# Altium integrated library My_Lib.IntLib: 28 symbols (part 1 of 2)
Pins are listed as number, name and electrical type; pins without a type are passive.

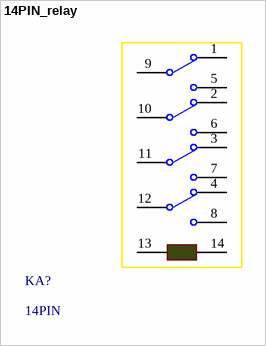
[diagram p0: symbol 14PIN_relay]

## 14PIN_relay
designator KA?, comment 14PIN
14脚继电器
pins: 1, 2, 3, 4, 5, 6, 7, 8, 9, 10, 11, 12, 13, 14


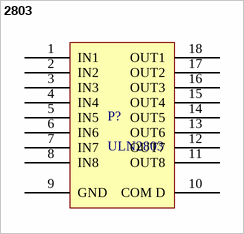
[diagram p1: symbol 2803]

## 2803
designator P?, comment ULN2803
非门
footprint 2803 (非门)
pins: 1 IN1, 2 IN2, 3 IN3, 4 IN4, 5 IN5, 6 IN6, 7 IN7, 8 IN8, 9 GND, 10 COM D, 11 OUT8, 12 OUT7, 13 OUT6, 14 OUT5, 15 OUT4, 16 OUT3, 17 OUT2, 18 OUT1


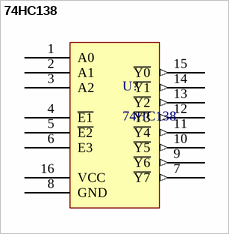
[diagram p2: symbol 74HC138]

## 74HC138
designator U?
38译码器
footprint 74HC138 (38译码器)
pins: 1 A0, 2 A1, 3 A2, 4 ~{E1}, 5 ~{E2}, 6 E3, 7 ~{Y7} (out), 8 GND, 9 ~{Y6} (out), 10 ~{Y5} (out), 11 ~{Y4} (out), 12 ~{Y3} (out), 13 ~{Y2} (out), 14 ~{Y1} (out), 15 ~{Y0} (out), 16 VCC (power)


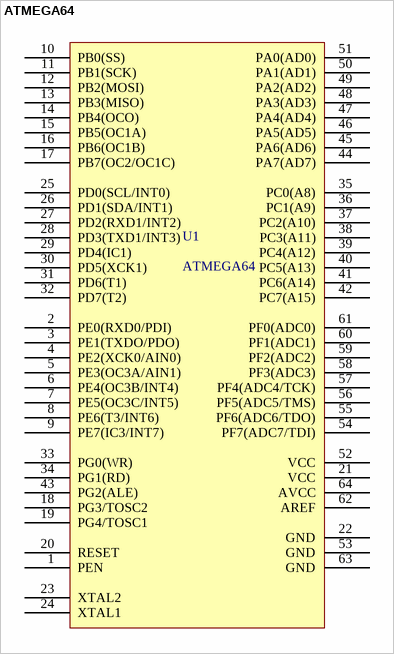
[diagram p3: symbol ATMEGA64]

## ATMEGA64
designator U1
单片机
footprint QFP64-1 (ATMEGA64)
pins: 1 PEN, 2 PE0(RXD0/PDI), 3 PE1(TXDO/PDO), 4 PE2(XCK0/AIN0), 5 PE3(OC3A/AIN1), 6 PE4(OC3B/INT4), 7 PE5(OC3C/INT5), 8 PE6(T3/INT6), 9 PE7(IC3/INT7), 10 PB0(SS), 11 PB1(SCK), 12 PB2(MOSI), 13 PB3(MISO), 14 PB4(OCO), 15 PB5(OC1A), 16 PB6(OC1B), 17 PB7(OC2/OC1C), 18 PG3/TOSC2, 19 PG4/TOSC1, 20 RESET, 21 VCC, 22 GND, 23 XTAL2, 24 XTAL1, 25 PD0(SCL/INT0), 26 PD1(SDA/INT1), 27 PD2(RXD1/INT2), 28 PD3(TXD1/INT3), 29 PD4(IC1), 30 PD5(XCK1), 31 PD6(T1), 32 PD7(T2), 33 PG0(WR), 34 PG1(RD), 35 PC0(A8), 36 PC1(A9), 37 PC2(A10), 38 PC3(A11), 39 PC4(A12), 40 PC5(A13), 41 PC6(A14), 42 PC7(A15), 43 PG2(ALE), 44 PA7(AD7), 45 PA6(AD6), 46 PA5(AD5), 47 PA4(AD4), 48 PA3(AD3), 49 PA2(AD2), 50 PA1(AD1), 51 PA0(AD0), 52 VCC, 53 GND, 54 PF7(ADC7/TDI), 55 PF6(ADC6/TDO), 56 PF5(ADC5/TMS), 57 PF4(ADC4/TCK), 58 PF3(ADC3), 59 PF2(ADC2), 60 PF1(ADC1), 61 PF0(ADC0), 62 AREF, 63 GND, 64 AVCC


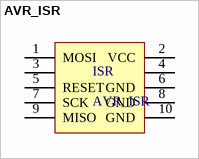
[diagram p4: symbol AVR_ISR]

## AVR_ISR
designator ISR
AVR单片机下载器
footprint AVR_10 (烧录器)
pins: 1 MOSI, 2 VCC, 3, 4, 5 RESET, 6 GND, 7 SCK, 8 GND, 9 MISO, 10 GND


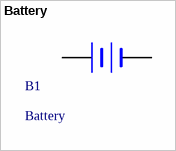
[diagram p5: symbol Battery]

## Battery
designator B1
电源
footprint Battery (电源座)
pins: 1 +, 2 -


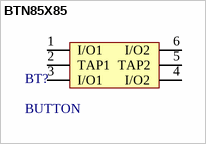
[diagram p6: symbol BTN85X85]

## BTN85X85
designator BT?, comment BUTTON
自锁按键
footprint BTN85X85 (自锁按键)
pins: 1 I/O1, 2 TAP1, 3 I/O1, 4 I/O2, 5 TAP2, 6 I/O2


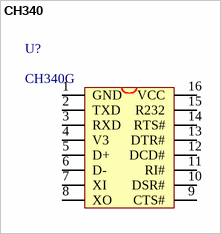
[diagram p7: symbol CH340]

## CH340
designator U?, comment CH340G
USB转串口
footprint CH340 (USB转串口)
pins: 1 GND, 2 TXD, 3 RXD, 4 V3, 5 D+, 6 D-, 7 XI, 8 XO, 9 CTS#, 10 DSR#, 11 RI#, 12 DCD#, 13 DTR#, 14 RTS#, 15 R232, 16 VCC


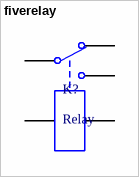
[diagram p8: symbol fiverelay]

## fiverelay
designator K?, comment Relay
常开常闭
footprint fiverelay
pins: 1 线圈1, 2 线圈2, 3 公共端, 4 常开, 5 常闭


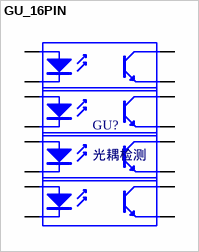
[diagram p9: symbol GU_16PIN]

## GU_16PIN
designator GU?, comment 光耦检测
16pin光耦检测
footprint 光耦座 (16PIN)
pins: 1 A "Anode", 2 K "Cathode", 3 E "Emitter", 4 C "Collector", 5 A "Anode", 6 K "Cathode", 7 E "Emitter", 8 C "Collector", 9 A "Anode", 10 K "Cathode", 11 E "Emitter", 12 C "Collector", 13 A "Anode", 14 K "Cathode", 15 E "Emitter", 16 C "Collector"


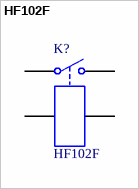
[diagram p10: symbol HF102F]

## HF102F
designator K?
Single-Pole Single-Throw Relay; Published: 24-Mar-1999; LatestRevisionDate: 17-Jul-2002; LatestRevisionNote: Re-released for DXP Platform.; PackageReference: MODULE4; Publisher: Altium Limited
simulation model SPSTRELAY (Spice Subcircuit)
footprint HF102F (12V继电器)
pins: 1, 2, 3, 4


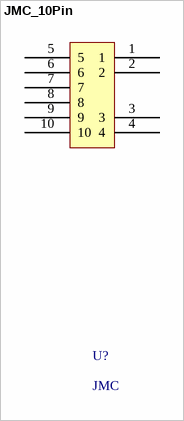
[diagram p11: symbol JMC_10Pin]

## JMC_10Pin
designator U?, comment JMC
江铃车窗端子
pins: 1, 2, 3, 4, 5, 6, 7, 8, 9, 10


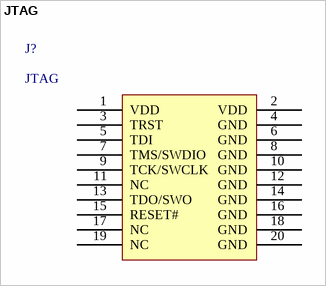
[diagram p12: symbol JTAG]

## JTAG
designator J?
JTAG下载器
footprint JTAG (下载器)
pins: 1 VDD, 2 VDD, 3 TRST, 4 GND, 5 TDI, 6 GND, 7 TMS/SWDIO, 8 GND, 9 TCK/SWCLK, 10 GND, 11 NC, 12 GND, 13 TDO/SWO, 14 GND, 15 RESET#, 16 GND, 17 NC, 18 GND, 19 NC, 20 GND


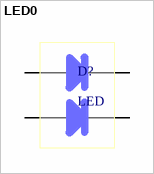
[diagram p13: symbol LED0]

## LED0
designator D?, comment LED
发光二极管
footprint LED0 (发光二极管)
pins: 1, 2, 3, 4


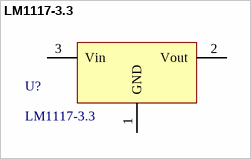
[diagram p14: symbol LM1117-3.3]

## LM1117-3.3
designator U?
5Vת3.3V
footprint LM1117-3.3 (稳压器件)
pins: 1 GND, 2 Vout, 3 Vin


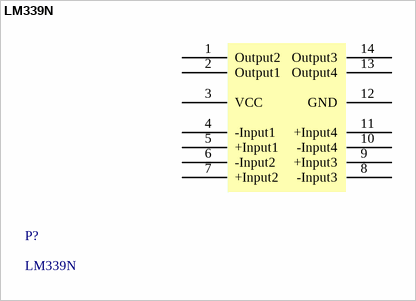
[diagram p15: symbol LM339N]

## LM339N
designator P?
电压比较器
footprint LM339N (电压比较器)
pins: 1 Output2, 2 Output1, 3 VCC, 4 -Input1, 5 +Input1, 6 -Input2, 7 +Input2, 8 -Input3, 9 +Input3, 10 -Input4, 11 +Input4, 12 GND, 13 Output4, 14 Output3


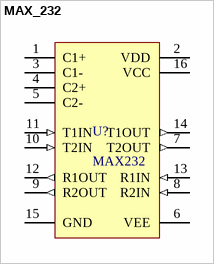
[diagram p16: symbol MAX_232]

## MAX_232
designator U?, comment MAX232
max232оƬ
footprint MAX_232 (串口通讯)
pins: 1 C1+, 2 VDD (power), 3 C1-, 4 C2+, 5 C2-, 6 VEE (power), 7 T2OUT (out), 8 R2IN (in), 9 R2OUT (out), 10 T2IN (in), 11 T1IN (in), 12 R1OUT (out), 13 R1IN (in), 14 T1OUT (out), 15 GND (power), 16 VCC (power)


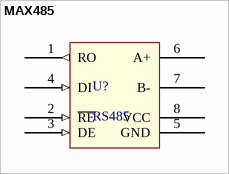
[diagram p17: symbol MAX485]

## MAX485
designator U?, comment RS485
485ͨѶ
footprint MAX485 (485通信)
pins: 1 RO (out), 2 ~{RE} (in), 3 DE (in), 4 DI (in), 5 GND, 6 A+, 7 B-, 8 VCC


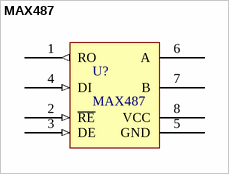
[diagram p18: symbol MAX487]

## MAX487
designator U?
485通信转换芯片
footprint MAX487 (485通信转换芯片)
pins: 1 RO (out), 2 ~{RE} (in), 3 DE (in), 4 DI (in), 5 GND (power), 6 A, 7 B, 8 VCC (power)


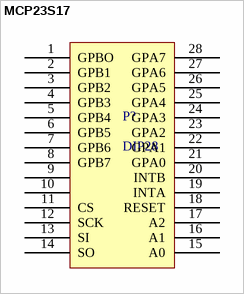
[diagram p19: symbol MCP23S17]

## MCP23S17
designator P?, comment DIP28
扩展模块
footprint MCP23S17 (扩展模块)
pins: 1 GPBO, 2 GPB1, 3 GPB2, 4 GPB3, 5 GPB4, 6 GPB5, 7 GPB6, 8 GPB7, 9, 10, 11 CS, 12 SCK, 13 SI, 14 SO, 15 A0, 16 A1, 17 A2, 18 RESET, 19 INTA, 20 INTB, 21 GPA0, 22 GPA1, 23 GPA2, 24 GPA3, 25 GPA4, 26 GPA5, 27 GPA6, 28 GPA7


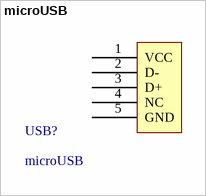
[diagram p20: symbol microUSB]

## microUSB
designator USB?
USB接头
footprint microUSB (USB)
pins: 1 VCC, 2 D-, 3 D+, 4 NC, 5 GND


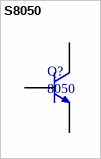
[diagram p21: symbol S8050]

## S8050
designator Q?, comment 8050
NPN三极管
footprint S8050_SOT23 (NPN三极管)
pins: 1, 2, 3


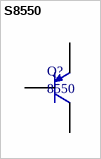
[diagram p22: symbol S8550]

## S8550
designator Q?, comment 8550
PNP三极管
footprint S8550_SOT23 (PNP三极管)
pins: 1, 2, 3
